# Altium footprint library SkyWar.PcbLib: 21 footprints (part 2 of 2)
Each footprint in its own frame and in the unit in brackets; x right, y up, seen from the top. Pads: shape width x height; smd on the part's side, far side on the other; paste and mask are expansions set on the pad; w line width, h text height; cw(c..) or ccw(c..) is an arc to the next point about the centre after c.
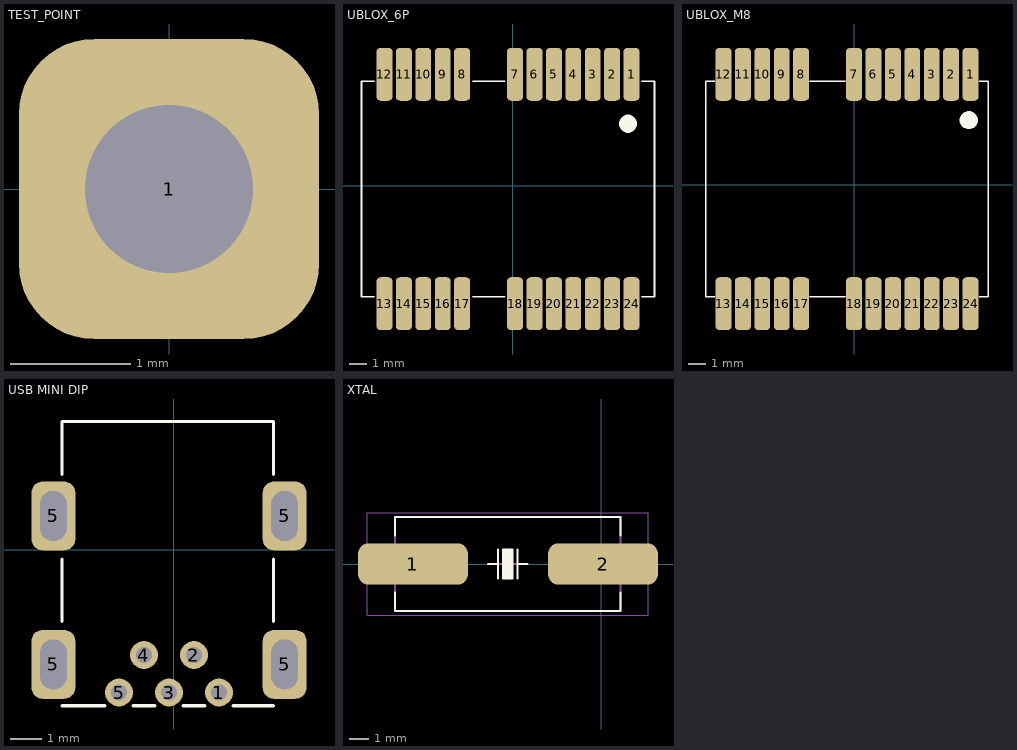
[diagram p1: the footprints below, top view; thin cyan lines are the x and y axes]

## TEST_POINT [mm]
pads (1):
  rrect50% 2.5x2.5 hole 1.4: 1(0,0)

## UBLOX_6P [mm]
pads (24):
  rrect50% 0.9x3 smd: 1(6.725,6.325) 2(5.625,6.325) 3(4.525,6.325) 4(3.425,6.325) 5(2.325,6.325) 6(1.225,6.325) 7(0.125,6.325) 8(-2.875,6.325) 9(-3.975,6.325) 10(-5.075,6.325) 11(-6.175,6.325) 12(-7.275,6.325) 13(-7.275,-6.675) 14(-6.175,-6.675) 15(-5.075,-6.675) 16(-3.975,-6.675) 17(-2.875,-6.675) 18(0.125,-6.675) 19(1.225,-6.675) 20(2.325,-6.675) 21(3.425,-6.675) 22(4.525,-6.675) 23(5.625,-6.675) 24(6.725,-6.675)
Top Overlay:
  region: 6.025,3.525 6.025,3.426 6.101,3.242 6.242,3.101 6.426,3.025 6.525,3.025 6.624,3.025 6.808,3.101 6.949,3.242 7.025,3.426 7.025,3.525 7.025,3.624 6.949,3.808 6.808,3.949 6.624,4.025 6.525,4.025 6.426,4.025 6.242,3.949 6.101,3.808 6.025,3.624
  lines w0.1: -7.875,-6.275 -8.575,-6.275 -8.575,5.925 -7.875,5.925 ; -2.275,-6.275 -0.475,-6.275 ; -2.275,5.925 -0.475,5.925 ; 7.325,-6.275 8.025,-6.275 8.025,5.925 7.325,5.925
3D body "User Library-UBLOX_GPS_NEO-6M.STEP": height 2.74, standoff 0.1, extent -8.525,-6.385 8.075,5.975

## UBLOX_M8 [mm]
pads (24):
  rrect50% 0.9x3 smd: 1(6.6,6.25) 2(5.5,6.25) 3(4.4,6.25) 4(3.3,6.25) 5(2.2,6.25) 6(1.1,6.25) 7(0,6.25) 8(-3,6.25) 9(-4.1,6.25) 10(-5.2,6.25) 11(-6.3,6.25) 12(-7.4,6.25) 13(-7.4,-6.75) 14(-6.3,-6.75) 15(-5.2,-6.75) 16(-4.1,-6.75) 17(-3,-6.75) 18(0,-6.75) 19(1.1,-6.75) 20(2.2,-6.75) 21(3.3,-6.75) 22(4.4,-6.75) 23(5.5,-6.75) 24(6.6,-6.75)
Top Overlay:
  region: 6,3.65 6,3.551 6.076,3.367 6.217,3.226 6.401,3.15 6.5,3.15 6.599,3.15 6.783,3.226 6.924,3.367 7,3.551 7,3.65 7,3.749 6.924,3.933 6.783,4.074 6.599,4.15 6.5,4.15 6.401,4.15 6.217,4.074 6.076,3.933 6,3.749
  lines w0.1: -7.9,-6.35 -8.4,-6.35 -8.4,5.85 -7.9,5.85 ; -2.5,-6.35 -0.5,-6.35 ; -2.5,5.85 -0.5,5.85 ; 7.1,-6.35 7.6,-6.35 7.6,5.85 7.1,5.85
3D body "User Library-neo-m8n.STEP": height 2.4, standoff 0, extent -8.4,-6.35 7.6,5.85

## USB MINI DIP [mm]
pads (9):
  round 0.9 hole 0.5: 1(1.45,-4.575) 2(0.65,-3.375) 3(-0.15,-4.575) 4(-0.95,-3.375) 5(-1.75,-4.575)
  rrect50% 1.4x2.2 hole 0.85 slot 1.6 at 90 deg: 5(-3.85,-3.675) 5(-3.85,1.075) 5(3.55,-3.675) 5(3.55,1.075)
Top Overlay:
  lines w0.1: -3.575,-5 -2.2,-5 ; -3.575,-2.3 -3.575,-0.3 ; -3.575,2.4 -3.575,4.1 3.2,4.1 3.2,2.4 ; -1.3,-5 -0.6,-5 ; 0.3,-5 1,-5 ; 1.9,-5 3.2,-5 ; 3.2,-2.3 3.2,-0.3
3D body "43797.stp": height 3.95, standoff -2.55, extent -4.225,-4.675 3.925,4.15

## XTAL [mm] "SODFL, 2-Leads, Body 4.70x12.70mm, IPC Low Density"
height 4.2
pads (2):
  rrect50% 5.6x2.1 smd: 1(-9.575,0) 2(0.1,0)
Top Overlay:
  region: -5,-0.75 -4.5,-0.75 -4.5,0.75 -5,0.75
  lines w0.1: -10.5,-1.45 -10.5,-2.4 1,-2.4 1,-1.45 ; -10.5,1.45 -10.5,2.4 1,2.4 1,1.45 ; -5.75,0 -5.25,0 ; -5.25,-0.75 -5.25,0.75 ; -4.25,-0.75 -4.25,0.75 ; -4.25,0 -3.75,0 ; -5,-0.75 -5,0.75 -4.5,0.75 -4.5,-0.75 -5,-0.75
Mechanical 13:
  lines w0.1: -10.5,-2.4 1,-2.4 1,2.4 -10.5,2.4 -10.5,-2.4
Mechanical 15:
  lines w0.05: -11.9,-2.6 2.4,-2.6 2.4,2.6 -11.9,2.6 -11.9,-2.6
  lines w0.1: -5.25,0 -4.25,0 ; -4.75,-0.5 -4.75,0.5
3D body "User Library-HC-49S.STEP": height 4.4, standoff 0.05, extent -10.9,-2.325 1.4,2.375